# Altium footprint library CONN_HDR_1.27MM_ST_SMD.PcbLib: 118 footprints (part 7 of 8)
Each footprint in its own frame and in the unit in brackets; x right, y up, seen from the top. Pads: shape width x height; smd on the part's side, far side on the other; paste and mask are expansions set on the pad; w line width, h text height; cw(c..) or ccw(c..) is an arc to the next point about the centre after c.
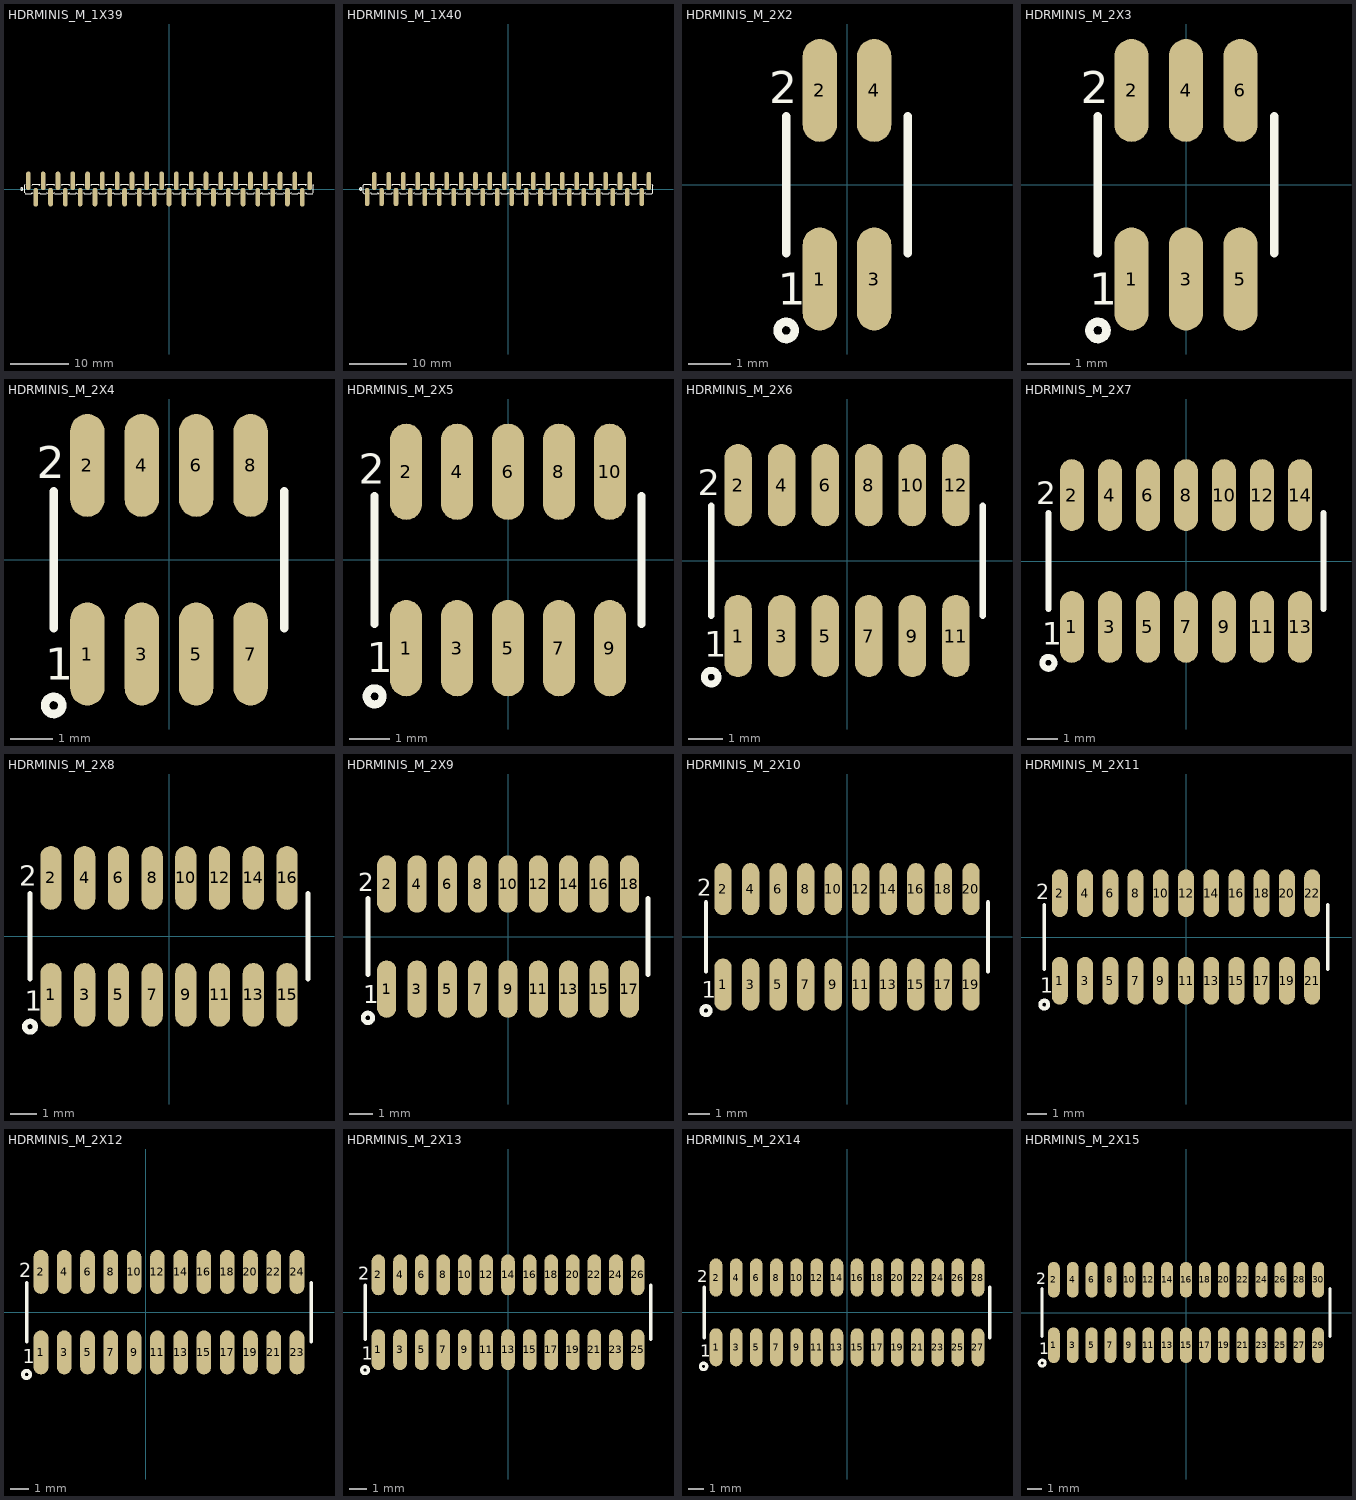
[diagram p6: the footprints below, top view; thin cyan lines are the x and y axes]

## HDRMINIS_M_1X39 [mm] "mini header (50mil pitch)"
pads (39):
  oval 0.8x3.2 smd mask+0.1: 1(-24.13,1.4) 2(-22.86,-1.4) 3(-21.59,1.4) 4(-20.32,-1.4) 5(-19.05,1.4) 6(-17.78,-1.4) 7(-16.51,1.4) 8(-15.24,-1.4) 9(-13.97,1.4) 10(-12.7,-1.4) 11(-11.43,1.4) 12(-10.16,-1.4) 13(-8.89,1.4) 14(-7.62,-1.4) 15(-6.35,1.4) 16(-5.08,-1.4) 17(-3.81,1.4) 18(-2.54,-1.4) 19(-1.27,1.4) 20(0,-1.4) 21(1.27,1.4) 22(2.54,-1.4) 23(3.81,1.4) 24(5.08,-1.4) 25(6.35,1.4) 26(7.62,-1.4) 27(8.89,1.4) 28(10.16,-1.4) 29(11.43,1.4) 30(12.7,-1.4) 31(13.97,1.4) 32(15.24,-1.4) 33(16.51,1.4) 34(17.78,-1.4) 35(19.05,1.4) 36(20.32,-1.4) 37(21.59,1.4) 38(22.86,-1.4) 39(24.13,1.4)
Top Overlay:
  drawing of 197 lines, arcs and shapes, not listed
3D body "BD021-03A-A1-0350-0200-0550-LB.stp": height 5.5, standoff 0, extent -24.77,-2.75 -20.96,2.75
3D body "BD021-02A-A1-0350-0200-0550-LB.stp": height 5.5, standoff 0, extent -20.955,-2.75 -18.415,2.75
3D body "BD021-02A-A1-0350-0200-0550-LB.stp": height 5.5, standoff 0, extent -18.415,-2.75 -15.875,2.75
3D body "BD021-02A-A1-0350-0200-0550-LB.stp": height 5.5, standoff 0, extent -15.875,-2.75 -13.335,2.75
3D body "BD021-02A-A1-0350-0200-0550-LB.stp": height 5.5, standoff 0, extent -13.335,-2.75 -10.795,2.75
3D body "BD021-02A-A1-0350-0200-0550-LB.stp": height 5.5, standoff 0, extent -10.795,-2.75 -8.255,2.75
3D body "BD021-02A-A1-0350-0200-0550-LB.stp": height 5.5, standoff 0, extent -8.255,-2.75 -5.715,2.75
3D body "BD021-02A-A1-0350-0200-0550-LB.stp": height 5.5, standoff 0, extent -5.715,-2.75 -3.175,2.75
3D body "BD021-02A-A1-0350-0200-0550-LB.stp": height 5.5, standoff 0, extent -3.175,-2.75 -0.635,2.75
3D body "BD021-02A-A1-0350-0200-0550-LB.stp": height 5.5, standoff 0, extent -0.635,-2.75 1.905,2.75
3D body "BD021-02A-A1-0350-0200-0550-LB.stp": height 5.5, standoff 0, extent 1.905,-2.75 4.445,2.75
3D body "BD021-02A-A1-0350-0200-0550-LB.stp": height 5.5, standoff 0, extent 4.445,-2.75 6.985,2.75
3D body "BD021-02A-A1-0350-0200-0550-LB.stp": height 5.5, standoff 0, extent 6.985,-2.75 9.525,2.75
3D body "BD021-02A-A1-0350-0200-0550-LB.stp": height 5.5, standoff 0, extent 9.525,-2.75 12.065,2.75
3D body "BD021-02A-A1-0350-0200-0550-LB.stp": height 5.5, standoff 0, extent 12.065,-2.75 14.605,2.75
3D body "BD021-02A-A1-0350-0200-0550-LB.stp": height 5.5, standoff 0, extent 14.605,-2.75 17.145,2.75
3D body "BD021-02A-A1-0350-0200-0550-LB.stp": height 5.5, standoff 0, extent 17.145,-2.75 19.685,2.75
3D body "BD021-02A-A1-0350-0200-0550-LB.stp": height 5.5, standoff 0, extent 19.685,-2.75 22.225,2.75
3D body "BD021-02A-A1-0350-0200-0550-LB.stp": height 5.5, standoff 0, extent 22.225,-2.75 24.765,2.75

## HDRMINIS_M_1X40 [mm] "mini header (50mil pitch)"
pads (40):
  oval 0.8x3.2 smd mask+0.1: 1(-24.765,-1.4) 2(-23.495,1.4) 3(-22.225,-1.4) 4(-20.955,1.4) 5(-19.685,-1.4) 6(-18.415,1.4) 7(-17.145,-1.4) 8(-15.875,1.4) 9(-14.605,-1.4) 10(-13.335,1.4) 11(-12.065,-1.4) 12(-10.795,1.4) 13(-9.525,-1.4) 14(-8.255,1.4) 15(-6.985,-1.4) 16(-5.715,1.4) 17(-4.445,-1.4) 18(-3.175,1.4) 19(-1.905,-1.4) 20(-0.635,1.4) 21(0.635,-1.4) 22(1.905,1.4) 23(3.175,-1.4) 24(4.445,1.4) 25(5.715,-1.4) 26(6.985,1.4) 27(8.255,-1.4) 28(9.525,1.4) 29(10.795,-1.4) 30(12.065,1.4) 31(13.335,-1.4) 32(14.605,1.4) 33(15.875,-1.4) 34(17.145,1.4) 35(18.415,-1.4) 36(19.685,1.4) 37(20.955,-1.4) 38(22.225,1.4) 39(23.495,-1.4) 40(24.765,1.4)
Top Overlay:
  drawing of 203 lines, arcs and shapes, not listed
3D body "BD021-02A-A1-0350-0200-0550-LB.stp": height 5.5, standoff 0, extent 22.86,-2.75 25.4,2.75
3D body "BD021-02A-A1-0350-0200-0550-LB.stp": height 5.5, standoff 0, extent 20.32,-2.75 22.86,2.75
3D body "BD021-02A-A1-0350-0200-0550-LB.stp": height 5.5, standoff 0, extent 17.78,-2.75 20.32,2.75
3D body "BD021-02A-A1-0350-0200-0550-LB.stp": height 5.5, standoff 0, extent 15.24,-2.75 17.78,2.75
3D body "BD021-02A-A1-0350-0200-0550-LB.stp": height 5.5, standoff 0, extent 12.7,-2.75 15.24,2.75
3D body "BD021-02A-A1-0350-0200-0550-LB.stp": height 5.5, standoff 0, extent 10.16,-2.75 12.7,2.75
3D body "BD021-02A-A1-0350-0200-0550-LB.stp": height 5.5, standoff 0, extent 7.62,-2.75 10.16,2.75
3D body "BD021-02A-A1-0350-0200-0550-LB.stp": height 5.5, standoff 0, extent 5.08,-2.75 7.62,2.75
3D body "BD021-02A-A1-0350-0200-0550-LB.stp": height 5.5, standoff 0, extent 2.54,-2.75 5.08,2.75
3D body "BD021-02A-A1-0350-0200-0550-LB.stp": height 5.5, standoff 0, extent 0,-2.75 2.54,2.75
3D body "BD021-02A-A1-0350-0200-0550-LB.stp": height 5.5, standoff 0, extent -2.54,-2.75 0,2.75
3D body "BD021-02A-A1-0350-0200-0550-LB.stp": height 5.5, standoff 0, extent -5.08,-2.75 -2.54,2.75
3D body "BD021-02A-A1-0350-0200-0550-LB.stp": height 5.5, standoff 0, extent -7.62,-2.75 -5.08,2.75
3D body "BD021-02A-A1-0350-0200-0550-LB.stp": height 5.5, standoff 0, extent -10.16,-2.75 -7.62,2.75
3D body "BD021-02A-A1-0350-0200-0550-LB.stp": height 5.5, standoff 0, extent -12.7,-2.75 -10.16,2.75
3D body "BD021-02A-A1-0350-0200-0550-LB.stp": height 5.5, standoff 0, extent -15.24,-2.75 -12.7,2.75
3D body "BD021-02A-A1-0350-0200-0550-LB.stp": height 5.5, standoff 0, extent -17.78,-2.75 -15.24,2.75
3D body "BD021-02A-A1-0350-0200-0550-LB.stp": height 5.5, standoff 0, extent -20.32,-2.75 -17.78,2.75
3D body "BD021-02A-A1-0350-0200-0550-LB.stp": height 5.5, standoff 0, extent -22.86,-2.75 -20.32,2.75
3D body "BD021-02A-A1-0350-0200-0550-LB.stp": height 5.5, standoff 0, extent -25.4,-2.75 -22.86,2.75

## HDRMINIS_M_2X2 [mm] "FCI Minitek127® BTB, HEADER UNSHROUDED, SMT, 4, 1.27mm"
pads (4):
  oval 0.8x2.4 smd mask+0.1: 1(-0.635,-2.2) 2(-0.635,2.2) 3(0.635,-2.2) 4(0.635,2.2)
Top Overlay:
  circle w0.2: c-1.42,-3.4 r0.2
  lines w0.2: -1.42,-1.6 -1.42,1.6 ; 1.42,-1.6 1.42,1.6
  text "1" at -1.62,-2.8 h0.75
  text "2" at -1.82,1.9 h0.75
3D body "20021121-00004XXLFc.stp": height 4.5, standoff 0, extent -1.27,-2.75 1.27,2.75

## HDRMINIS_M_2X3 [mm] "FCI Minitek127® BTB, HEADER UNSHROUDED, SMT, 6, 1.27mm"
pads (6):
  oval 0.8x2.4 smd mask+0.1: 1(-1.27,-2.2) 2(-1.27,2.2) 3(0,-2.2) 4(0,2.2) 5(1.27,-2.2) 6(1.27,2.2)
Top Overlay:
  circle w0.2: c-2.055,-3.4 r0.2
  lines w0.2: -2.055,-1.6 -2.055,1.6 ; 2.055,-1.6 2.055,1.6
  text "1" at -2.255,-2.8 h0.75
  text "2" at -2.455,1.9 h0.75
3D body "20021121-00006XXLFc.stp": height 4.5, standoff 0, extent -1.905,-2.75 1.905,2.75

## HDRMINIS_M_2X4 [mm] "FCI Minitek127® BTB, HEADER UNSHROUDED, SMT, 8, 1.27mm"
pads (8):
  oval 0.8x2.4 smd mask+0.1: 1(-1.905,-2.2) 2(-1.905,2.2) 3(-0.635,-2.2) 4(-0.635,2.2) 5(0.635,-2.2) 6(0.635,2.2) 7(1.905,-2.2) 8(1.905,2.2)
Top Overlay:
  circle w0.2: c-2.69,-3.4 r0.2
  lines w0.2: -2.69,-1.6 -2.69,1.6 ; 2.69,-1.6 2.69,1.6
  text "2" at -3.09,1.9 h0.75
  text "1" at -2.89,-2.8 h0.75
3D body "20021121-00004XXLFc.stp": height 4.5, standoff 0, extent 0,-2.75 2.54,2.75
3D body "20021121-00004XXLFc.stp": height 4.5, standoff 0, extent -2.54,-2.75 0,2.75

## HDRMINIS_M_2X5 [mm] "FCI Minitek127® BTB, HEADER UNSHROUDED, SMT, 10, 1.27mm"
pads (10):
  oval 0.8x2.4 smd mask+0.1: 1(-2.54,-2.2) 2(-2.54,2.2) 3(-1.27,-2.2) 4(-1.27,2.2) 5(0,-2.2) 6(0,2.2) 7(1.27,-2.2) 8(1.27,2.2) 9(2.54,-2.2) 10(2.54,2.2)
Top Overlay:
  circle w0.2: c-3.325,-3.4 r0.2
  lines w0.2: -3.325,-1.6 -3.325,1.6 ; 3.325,-1.6 3.325,1.6
  text "1" at -3.525,-2.8 h0.75
  text "2" at -3.725,1.9 h0.75
3D body "20021121-00006XXLFc.stp": height 4.5, standoff 0, extent -0.635,-2.75 3.175,2.75
3D body "20021121-00004XXLFc.stp": height 4.5, standoff 0, extent -3.175,-2.75 -0.635,2.75

## HDRMINIS_M_2X6 [mm] "FCI Minitek127® BTB, HEADER UNSHROUDED, SMT, 12, 1.27mm"
pads (12):
  oval 0.8x2.4 smd mask+0.1: 1(-3.175,-2.2) 2(-3.175,2.2) 3(-1.905,-2.2) 4(-1.905,2.2) 5(-0.635,-2.2) 6(-0.635,2.2) 7(0.635,-2.2) 8(0.635,2.2) 9(1.905,-2.2) 10(1.905,2.2) 11(3.175,-2.2) 12(3.175,2.2)
Top Overlay:
  circle w0.2: c-3.96,-3.4 r0.2
  lines w0.2: -3.96,-1.6 -3.96,1.6 ; 3.96,-1.6 3.96,1.6
  text "1" at -4.16,-2.8 h0.75
  text "2" at -4.36,1.9 h0.75
3D body "20021121-00004XXLFc.stp": height 4.5, standoff 0, extent -3.81,-2.75 -1.27,2.75
3D body "20021121-00004XXLFc.stp": height 4.5, standoff 0, extent -1.27,-2.75 1.27,2.75
3D body "20021121-00004XXLFc.stp": height 4.5, standoff 0, extent 1.27,-2.75 3.81,2.75

## HDRMINIS_M_2X7 [mm] "FCI Minitek127® BTB, HEADER UNSHROUDED, SMT, 14, 1.27mm"
pads (14):
  oval 0.8x2.4 smd mask+0.1: 1(-3.81,-2.2) 2(-3.81,2.2) 3(-2.54,-2.2) 4(-2.54,2.2) 5(-1.27,-2.2) 6(-1.27,2.2) 7(0,-2.2) 8(0,2.2) 9(1.27,-2.2) 10(1.27,2.2) 11(2.54,-2.2) 12(2.54,2.2) 13(3.81,-2.2) 14(3.81,2.2)
Top Overlay:
  circle w0.2: c-4.595,-3.4 r0.2
  lines w0.2: -4.595,-1.6 -4.595,1.6 ; 4.595,-1.6 4.595,1.6
  text "1" at -4.795,-2.8 h0.75
  text "2" at -4.995,1.9 h0.75
3D body "20021121-00004XXLFc.stp": height 4.5, standoff 0, extent -4.445,-2.75 -1.905,2.75
3D body "20021121-00006XXLFc.stp": height 4.5, standoff 0, extent -1.905,-2.75 1.905,2.75
3D body "20021121-00004XXLFc.stp": height 4.5, standoff 0, extent 1.905,-2.75 4.445,2.75

## HDRMINIS_M_2X8 [mm] "FCI Minitek127® BTB, HEADER UNSHROUDED, SMT, 16, 1.27mm"
pads (16):
  oval 0.8x2.4 smd mask+0.1: 1(-4.445,-2.2) 2(-4.445,2.2) 3(-3.175,-2.2) 4(-3.175,2.2) 5(-1.905,-2.2) 6(-1.905,2.2) 7(-0.635,-2.2) 8(-0.635,2.2) 9(0.635,-2.2) 10(0.635,2.2) 11(1.905,-2.2) 12(1.905,2.2) 13(3.175,-2.2) 14(3.175,2.2) 15(4.445,-2.2) 16(4.445,2.2)
Top Overlay:
  circle w0.2: c-5.23,-3.4 r0.2
  lines w0.2: -5.23,-1.6 -5.23,1.6 ; 5.23,-1.6 5.23,1.6
  text "1" at -5.43,-2.8 h0.75
  text "2" at -5.63,1.9 h0.75
3D body "20021121-00004XXLFc.stp": height 4.5, standoff 0, extent -2.54,-2.75 0,2.75
3D body "20021121-00004XXLFc.stp": height 4.5, standoff 0, extent -5.08,-2.75 -2.54,2.75
3D body "20021121-00004XXLFc.stp": height 4.5, standoff 0, extent 2.54,-2.75 5.08,2.75
3D body "20021121-00004XXLFc.stp": height 4.5, standoff 0, extent 0,-2.75 2.54,2.75

## HDRMINIS_M_2X9 [mm] "FCI Minitek127® BTB, HEADER UNSHROUDED, SMT, 18, 1.27mm"
pads (18):
  oval 0.8x2.4 smd mask+0.1: 1(-5.08,-2.2) 2(-5.08,2.2) 3(-3.81,-2.2) 4(-3.81,2.2) 5(-2.54,-2.2) 6(-2.54,2.2) 7(-1.27,-2.2) 8(-1.27,2.2) 9(0,-2.2) 10(0,2.2) 11(1.27,-2.2) 12(1.27,2.2) 13(2.54,-2.2) 14(2.54,2.2) 15(3.81,-2.2) 16(3.81,2.2) 17(5.08,-2.2) 18(5.08,2.2)
Top Overlay:
  circle w0.2: c-5.865,-3.4 r0.2
  lines w0.2: -5.865,-1.6 -5.865,1.6 ; 5.865,-1.6 5.865,1.6
  text "2" at -6.265,1.9 h0.75
  text "1" at -6.065,-2.8 h0.75
3D body "20021121-00006XXLFc.stp": height 4.5, standoff 0, extent 1.905,-2.75 5.715,2.75
3D body "20021121-00004XXLFc.stp": height 4.5, standoff 0, extent -0.635,-2.75 1.905,2.75
3D body "20021121-00004XXLFc.stp": height 4.5, standoff 0, extent -5.715,-2.75 -3.175,2.75
3D body "20021121-00004XXLFc.stp": height 4.5, standoff 0, extent -3.175,-2.75 -0.635,2.75

## HDRMINIS_M_2X10 [mm] "FCI Minitek127® BTB, HEADER UNSHROUDED, SMT, 20   Part Number: 2002112100020D4LF"
pads (20):
  oval 0.8x2.4 smd mask+0.1: 1(-5.715,-2.2) 2(-5.715,2.2) 3(-4.445,-2.2) 4(-4.445,2.2) 5(-3.175,-2.2) 6(-3.175,2.2) 7(-1.905,-2.2) 8(-1.905,2.2) 9(-0.635,-2.2) 10(-0.635,2.2) 11(0.635,-2.2) 12(0.635,2.2) 13(1.905,-2.2) 14(1.905,2.2) 15(3.175,-2.2) 16(3.175,2.2) 17(4.445,-2.2) 18(4.445,2.2) 19(5.715,-2.2) 20(5.715,2.2)
Top Overlay:
  circle w0.2: c-6.5,-3.4 r0.2
  lines w0.2: -6.5,-1.6 -6.5,1.6 ; 6.5,-1.6 6.5,1.6
  text "2" at -6.9,1.9 h0.75
  text "1" at -6.7,-2.8 h0.75
3D body "2002112100020d4lf.stp": height 4.5, standoff 0, extent -6.35,-2.8 6.35,2.7

## HDRMINIS_M_2X11 [mm] "FCI Minitek127® BTB, HEADER UNSHROUDED, SMT, 22   Part Number: 2002112100020D4LF"
pads (22):
  oval 0.8x2.4 smd mask+0.1: 1(-6.35,-2.2) 2(-6.35,2.2) 3(-5.08,-2.2) 4(-5.08,2.2) 5(-3.81,-2.2) 6(-3.81,2.2) 7(-2.54,-2.2) 8(-2.54,2.2) 9(-1.27,-2.2) 10(-1.27,2.2) 11(0,-2.2) 12(0,2.2) 13(1.27,-2.2) 14(1.27,2.2) 15(2.54,-2.2) 16(2.54,2.2) 17(3.81,-2.2) 18(3.81,2.2) 19(5.08,-2.2) 20(5.08,2.2) 21(6.35,-2.2) 22(6.35,2.2)
Top Overlay:
  circle w0.2: c-7.135,-3.4 r0.2
  lines w0.2: -7.135,-1.6 -7.135,1.6 ; 7.135,-1.6 7.135,1.6
  text "2" at -7.535,1.9 h0.75
  text "1" at -7.335,-2.8 h0.75
3D body "20021121-00022XXLFc.stp": height 4.5, standoff 0, extent -6.985,-2.8 6.985,2.7

## HDRMINIS_M_2X12 [mm] "FCI Minitek127® BTB, HEADER UNSHROUDED, SMT, 24"
pads (24):
  oval 0.8x2.4 smd mask+0.1: 1(-5.715,-2.2) 2(-5.715,2.2) 3(-4.445,-2.2) 4(-4.445,2.2) 5(-3.175,-2.2) 6(-3.175,2.2) 7(-1.905,-2.2) 8(-1.905,2.2) 9(-0.635,-2.2) 10(-0.635,2.2) 11(0.635,-2.2) 12(0.635,2.2) 13(1.905,-2.2) 14(1.905,2.2) 15(3.175,-2.2) 16(3.175,2.2) 17(4.445,-2.2) 18(4.445,2.2) 19(5.715,-2.2) 20(5.715,2.2) 21(6.985,-2.2) 22(6.985,2.2) 23(8.255,-2.2) 24(8.255,2.2)
Top Overlay:
  circle w0.2: c-6.5,-3.4 r0.2
  lines w0.2: -6.5,-1.6 -6.5,1.6 ; 9.04,-1.6 9.04,1.6
  text "2" at -6.9,1.9 h0.75
  text "1" at -6.7,-2.8 h0.75
3D body "2002112100020d4lf.stp": height 4.5, standoff 0, extent -6.35,-2.8 6.35,2.7
3D body "20021121-00004XXLFc.stp": height 4.5, standoff 0, extent 6.35,-2.8 8.89,2.7

## HDRMINIS_M_2X13 [mm] "FCI Minitek127® BTB, HEADER UNSHROUDED, SMT"
pads (26):
  oval 0.8x2.4 smd mask+0.1: 1(-7.62,-2.2) 2(-7.62,2.2) 3(-6.35,-2.2) 4(-6.35,2.2) 5(-5.08,-2.2) 6(-5.08,2.2) 7(-3.81,-2.2) 8(-3.81,2.2) 9(-2.54,-2.2) 10(-2.54,2.2) 11(-1.27,-2.2) 12(-1.27,2.2) 13(0,-2.2) 14(0,2.2) 15(1.27,-2.2) 16(1.27,2.2) 17(2.54,-2.2) 18(2.54,2.2) 19(3.81,-2.2) 20(3.81,2.2) 21(5.08,-2.2) 22(5.08,2.2) 23(6.35,-2.2) 24(6.35,2.2) 25(7.62,-2.2) 26(7.62,2.2)
Top Overlay:
  circle w0.2: c-8.405,-3.4 r0.2
  lines w0.2: -8.405,-1.6 -8.405,1.6 ; 8.405,-1.6 8.405,1.6
  text "1" at -8.605,-2.8 h0.75
  text "2" at -8.805,1.9 h0.75
3D body "2002112100020d4lf.stp": height 4.5, standoff 0, extent -8.255,-2.8 4.445,2.7
3D body "20021121-00004XXLFc.stp": height 4.5, standoff 0, extent 4.445,-2.75 6.985,2.75
3D body "20021121-00004XXLFc.stp": height 4.5, standoff 0, extent 5.715,-2.75 8.255,2.75

## HDRMINIS_M_2X14 [mm] "FCI Minitek127® BTB, HEADER UNSHROUDED, SMT"
pads (28):
  oval 0.8x2.4 smd mask+0.1: 1(-8.255,-2.2) 2(-8.255,2.2) 3(-6.985,-2.2) 4(-6.985,2.2) 5(-5.715,-2.2) 6(-5.715,2.2) 7(-4.445,-2.2) 8(-4.445,2.2) 9(-3.175,-2.2) 10(-3.175,2.2) 11(-1.905,-2.2) 12(-1.905,2.2) 13(-0.635,-2.2) 14(-0.635,2.2) 15(0.635,-2.2) 16(0.635,2.2) 17(1.905,-2.2) 18(1.905,2.2) 19(3.175,-2.2) 20(3.175,2.2) 21(4.445,-2.2) 22(4.445,2.2) 23(5.715,-2.2) 24(5.715,2.2) 25(6.985,-2.2) 26(6.985,2.2) 27(8.255,-2.2) 28(8.255,2.2)
Top Overlay:
  circle w0.2: c-9.04,-3.4 r0.2
  lines w0.2: -9,-1.6 -9,1.6 ; 9,-1.6 9,1.6
  text "1" at -9.24,-2.8 h0.75
  text "2" at -9.44,1.9 h0.75
3D body "2002112100020d4lf.stp": height 4.5, standoff 0, extent -8.89,-2.8 3.81,2.7
3D body "20021121-00004XXLFc.stp": height 4.5, standoff 0, extent 3.81,-2.75 6.35,2.75
3D body "20021121-00004XXLFc.stp": height 4.5, standoff 0, extent 6.35,-2.75 8.89,2.75

## HDRMINIS_M_2X15 [mm] "FCI Minitek127® BTB, HEADER UNSHROUDED, SMT"
pads (30):
  oval 0.8x2.4 smd mask+0.1: 1(-8.89,-2.2) 2(-8.89,2.2) 3(-7.62,-2.2) 4(-7.62,2.2) 5(-6.35,-2.2) 6(-6.35,2.2) 7(-5.08,-2.2) 8(-5.08,2.2) 9(-3.81,-2.2) 10(-3.81,2.2) 11(-2.54,-2.2) 12(-2.54,2.2) 13(-1.27,-2.2) 14(-1.27,2.2) 15(0,-2.2) 16(0,2.2) 17(1.27,-2.2) 18(1.27,2.2) 19(2.54,-2.2) 20(2.54,2.2) 21(3.81,-2.2) 22(3.81,2.2) 23(5.08,-2.2) 24(5.08,2.2) 25(6.35,-2.2) 26(6.35,2.2) 27(7.62,-2.2) 28(7.62,2.2) 29(8.89,-2.2) 30(8.89,2.2)
Top Overlay:
  circle w0.2: c-9.675,-3.4 r0.2
  lines w0.2: -9.675,-1.6 -9.675,1.6 ; 9.675,-1.6 9.675,1.6
  text "1" at -9.875,-2.8 h0.75
  text "2" at -10.075,1.9 h0.75
3D body "2002112100020d4lf.stp": height 4.5, standoff 0, extent -9.525,-2.8 3.175,2.7
3D body "20021121-00004XXLFc.stp": height 4.5, standoff 0, extent 3.175,-2.75 5.715,2.75
3D body "20021121-00004XXLFc.stp": height 4.5, standoff 0, extent 5.715,-2.75 8.255,2.75
3D body "20021121-00004XXLFc.stp": height 4.5, standoff 0, extent 6.985,-2.75 9.525,2.75